# Altium footprint library General.PCBLIB: 231 footprints (part 10 of 15)
Each footprint in its own frame and in the unit in brackets; x right, y up, seen from the top. Pads: shape width x height; smd on the part's side, far side on the other; paste and mask are expansions set on the pad; w line width, h text height; cw(c..) or ccw(c..) is an arc to the next point about the centre after c.
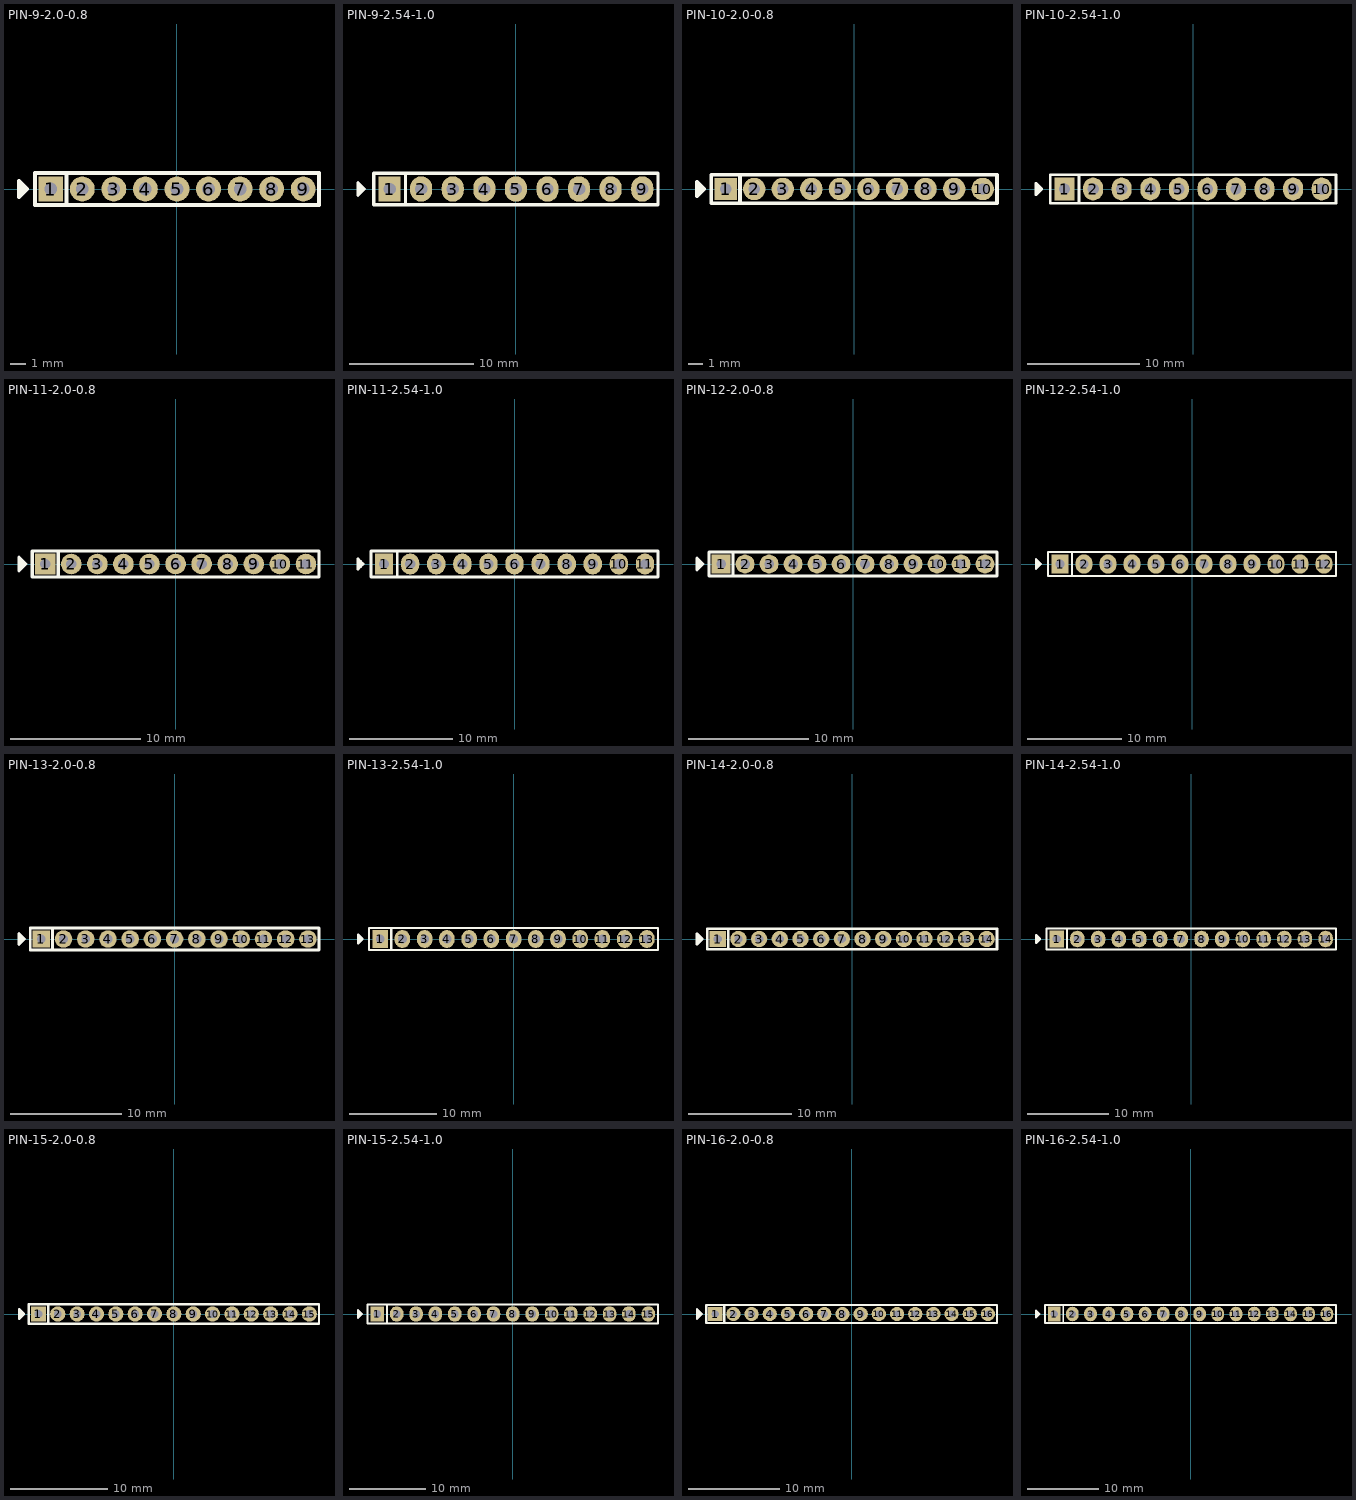
[diagram p9: the footprints below, top view; thin cyan lines are the x and y axes]

## PIN-9-2.0-0.8 [mil] "Pin Header"
height 149.61
pads (9):
  rect 62x62 hole 31.5: 1(-314.96,0)
  round 62 hole 31.5: 2(-236.22,0) 3(-157.48,0) 4(-78.74,0) 5(0,0) 6(78.74,0) 7(157.48,0) 8(236.22,0) 9(314.96,0)
Top Overlay:
  lines w10: -384.02,-10 -384.02,10 ; -275.59,-39.37 -275.59,39.37 ; -394.02,-20 -374.02,0 -394.02,20 -394.02,-20 ; -354.33,-39.37 -354.33,39.37 354.33,39.37 354.33,-39.37 -354.33,-39.37
3D body "Samtec-MTMM-109-02-G-S-150.STEP": height 209, standoff -46, extent -354.33,-39.37 353.97,39.33

## PIN-9-2.54-1.0 [mil] "Pin Header"
height 374.02
pads (9):
  rect 70x80 hole 39.37: 1(-400,0)
  oval 70x80 hole 39.37: 2(-300,0) 3(-200,0) 4(-100,0) 5(0,0) 6(100,0) 7(200,0) 8(300,0) 9(400,0)
Top Overlay:
  lines w10: -490,-10 -490,10 ; -350,-50 -350,50 ; -500,-20 -500,20 -480,0 -500,-20 ; -450,-50 -450,50 450,50 450,-50 -450,-50
3D body "PIN9_100mils.STEP": height 397.64, standoff -59.06, extent -450,-50 450,50

## PIN-10-2.0-0.8 [mm] "Pin Header"
height 3.8
pads (10):
  rect 1.575x1.575 hole 0.8: 1(-9,0)
  round 1.575 hole 0.8: 2(-7,0) 3(-5,0) 4(-3,0) 5(-1,0) 6(1,0) 7(3,0) 8(5,0) 9(7,0) 10(9,0)
Top Overlay:
  lines w0.254: -10.754,-0.254 -10.754,0.254 ; -8,-1 -8,1 ; -11.008,-0.508 -11.008,0.508 -10.5,0 -11.008,-0.508 ; -10,-1 10,-1 10,1 -10,1 -10,-1
3D body "Samtec-MTMM-110-02-G-S-150.STEP": height 5.31, standoff -1.17, extent -10,-1 9.99,0.999

## PIN-10-2.54-1.0 [mil] "Pin Header"
height 374.02
pads (10):
  rect 70x80 hole 39.37: 1(-450,0)
  oval 70x80 hole 39.37: 2(-350,0) 3(-250,0) 4(-150,0) 5(-50,0) 6(50,0) 7(150,0) 8(250,0) 9(350,0) 10(450,0)
Top Overlay:
  lines w10: -540,-10 -540,10 ; -400,-50 -400,50 ; -550,-20 -530,0 -550,20 -550,-20 ; -500,-50 500,-50 500,50 -500,50 -500,-50
3D body "PIN10_100mils.STEP": height 397.64, standoff -59.06, extent -500,-50 500,50

## PIN-11-2.0-0.8 [mil] "Pin Header"
height 149.61
pads (11):
  rect 62x62 hole 31.5: 1(-393.7,0)
  round 62 hole 31.5: 2(-314.96,0) 3(-236.22,0) 4(-157.48,0) 5(-78.74,0) 6(0,0) 7(78.74,0) 8(157.48,0) 9(236.22,0) 10(314.96,0) 11(393.7,0)
Top Overlay:
  lines w10: -462.76,-10 -462.76,10 ; -354.33,-39.37 -354.33,39.37 ; -472.76,-20 -472.76,20 -452.76,0 -472.76,-20 ; -433.07,-39.37 433.07,-39.37 433.07,39.37 -433.07,39.37 -433.07,-39.37
3D body "Samtec-MTMM-111-02-G-S-150.STEP": height 209, standoff -46, extent -433.07,-39.37 432.63,39.33

## PIN-11-2.54-1.0 [mil] "Pin Header"
height 374.02
pads (11):
  rect 70x80 hole 39.37: 1(-500,0)
  oval 70x80 hole 39.37: 2(-400,0) 3(-300,0) 4(-200,0) 5(-100,0) 6(0,0) 7(100,0) 8(200,0) 9(300,0) 10(400,0) 11(500,0)
Top Overlay:
  lines w10: -590,-10 -590,10 ; -450,-50 -450,50 ; -600,-20 -580,0 -600,20 -600,-20 ; -550,-50 550,-50 550,50 -550,50 -550,-50
3D body "PIN11_100mils.STEP": height 397.64, standoff -59.06, extent -550,-50 550,50

## PIN-12-2.0-0.8 [mm] "Pin Header"
height 3.8
pads (12):
  rect 1.575x1.575 hole 0.8: 1(-11,0)
  round 1.575 hole 0.8: 2(-9,0) 3(-7,0) 4(-5,0) 5(-3,0) 6(-1,0) 7(1,0) 8(3,0) 9(5,0) 10(7,0) 11(9,0) 12(11,0)
Top Overlay:
  lines w0.254: -12.754,-0.254 -12.754,0.254 ; -10,-1 -10,1 ; -13.008,-0.508 -12.5,0 -13.008,0.508 -13.008,-0.508 ; -12,-1 -12,1 12,1 12,-1 -12,-1
3D body "Samtec-MTMM-112-02-G-S-150.STEP": height 5.31, standoff -1.17, extent -12,-1 11.988,0.999

## PIN-12-2.54-1.0 [mil] "Pin Header"
height 374.02
pads (12):
  rect 70x80 hole 39.37: 1(-550,0)
  oval 70x80 hole 39.37: 2(-450,0) 3(-350,0) 4(-250,0) 5(-150,0) 6(-50,0) 7(50,0) 8(150,0) 9(250,0) 10(350,0) 11(450,0) 12(550,0)
Top Overlay:
  lines w10: -640,-10 -640,10 ; -500,-50 -500,50 ; -650,-20 -630,0 -650,20 -650,-20 ; -600,-50 600,-50 600,50 -600,50 -600,-50
3D body "PIN12_100mils.STEP": height 397.64, standoff -59.06, extent -600,-50 600,50

## PIN-13-2.0-0.8 [mil] "Pin Header"
height 149.61
pads (13):
  rect 62x62 hole 31.5: 1(-472.44,0)
  round 62 hole 31.5: 2(-393.7,0) 3(-314.96,0) 4(-236.22,0) 5(-157.48,0) 6(-78.74,0) 7(0,0) 8(78.74,0) 9(157.48,0) 10(236.22,0) 11(314.96,0) 12(393.7,0) 13(472.44,0)
Top Overlay:
  lines w10: -541.5,-10 -541.5,10 ; -433.07,-39.37 -433.07,39.37 ; -551.5,-20 -551.5,20 -531.5,0 -551.5,-20 ; -511.81,-39.37 511.81,-39.37 511.81,39.37 -511.81,39.37 -511.81,-39.37
3D body "Samtec-MTMM-113-02-G-S-150.STEP": height 209, standoff -46, extent -511.81,-39.37 511.29,39.33

## PIN-13-2.54-1.0 [mil] "Pin Header"
height 374.02
pads (13):
  rect 70x80 hole 39.37: 1(-600,0)
  oval 70x80 hole 39.37: 2(-500,0) 3(-400,0) 4(-300,0) 5(-200,0) 6(-100,0) 7(0,0) 8(100,0) 9(200,0) 10(300,0) 11(400,0) 12(500,0) 13(600,0)
Top Overlay:
  lines w10: -690,-10 -690,10 ; -550,-50 -550,50 ; -700,-20 -680,0 -700,20 -700,-20 ; -650,-50 650,-50 650,50 -650,50 -650,-50
3D body "PIN13_100mils.STEP": height 397.64, standoff -59.06, extent -650,-50 650,50

## PIN-14-2.0-0.8 [mm] "Pin Header"
height 3.8
pads (14):
  rect 1.575x1.575 hole 0.8: 1(-13,0)
  round 1.575 hole 0.8: 2(-11,0) 3(-9,0) 4(-7,0) 5(-5,0) 6(-3,0) 7(-1,0) 8(1,0) 9(3,0) 10(5,0) 11(7,0) 12(9,0) 13(11,0) 14(13,0)
Top Overlay:
  lines w0.254: -14.754,-0.254 -14.754,0.254 ; -12,-1 -12,1 ; -15.008,-0.508 -14.5,0 -15.008,0.508 -15.008,-0.508 ; -14,-1 -14,1 14,1 14,-1 -14,-1
3D body "Samtec-MTMM-114-02-G-S-150.STEP": height 5.31, standoff -1.17, extent -14,-1 13.986,0.999

## PIN-14-2.54-1.0 [mil] "Pin Header"
height 374.02
pads (14):
  rect 70x80 hole 39.37: 1(-650,0)
  oval 70x80 hole 39.37: 2(-550,0) 3(-450,0) 4(-350,0) 5(-250,0) 6(-150,0) 7(-50,0) 8(50,0) 9(150,0) 10(250,0) 11(350,0) 12(450,0) 13(550,0) 14(650,0)
Top Overlay:
  lines w10: -740,-10 -740,10 ; -600,-50 -600,50 ; -750,-20 -750,20 -730,0 -750,-20 ; -700,-50 -700,50 700,50 700,-50 -700,-50
3D body "PIN14_100mils.STEP": height 397.64, standoff -59.06, extent -700,-50 700,50

## PIN-15-2.0-0.8 [mil] "Pin Header"
height 149.61
pads (15):
  rect 62x62 hole 31.5: 1(-551.18,0)
  round 62 hole 31.5: 2(-472.44,0) 3(-393.7,0) 4(-314.96,0) 5(-236.22,0) 6(-157.48,0) 7(-78.74,0) 8(0,0) 9(78.74,0) 10(157.48,0) 11(236.22,0) 12(314.96,0) 13(393.7,0) 14(472.44,0) 15(551.18,0)
Top Overlay:
  lines w10: -620.24,-10 -620.24,10 ; -511.81,-39.37 -511.81,39.37 ; -630.24,-20 -610.24,0 -630.24,20 -630.24,-20 ; -590.55,-39.37 -590.55,39.37 590.55,39.37 590.55,-39.37 -590.55,-39.37
3D body "Samtec-MTMM-115-02-G-S-150.STEP": height 209, standoff -46, extent -590.55,-39.37 589.95,39.33

## PIN-15-2.54-1.0 [mil] "Pin Header"
height 374.02
pads (15):
  rect 70x80 hole 39.37: 1(-700,0)
  oval 70x80 hole 39.37: 2(-600,0) 3(-500,0) 4(-400,0) 5(-300,0) 6(-200,0) 7(-100,0) 8(0,0) 9(100,0) 10(200,0) 11(300,0) 12(400,0) 13(500,0) 14(600,0) 15(700,0)
Top Overlay:
  lines w10: -790,-10 -790,10 ; -650,-50 -650,50 ; -800,-20 -780,0 -800,20 -800,-20 ; -750,-50 750,-50 750,50 -750,50 -750,-50
3D body "PIN15_100mils.STEP": height 397.64, standoff -59.06, extent -750,-50 750,50

## PIN-16-2.0-0.8 [mm] "Pin Header"
height 3.8
pads (16):
  rect 1.575x1.575 hole 0.8: 1(-15,0)
  round 1.575 hole 0.8: 2(-13,0) 3(-11,0) 4(-9,0) 5(-7,0) 6(-5,0) 7(-3,0) 8(-1,0) 9(1,0) 10(3,0) 11(5,0) 12(7,0) 13(9,0) 14(11,0) 15(13,0) 16(15,0)
Top Overlay:
  lines w0.254: -16.754,-0.254 -16.754,0.254 ; -14,-1 -14,1 ; -17.008,-0.508 -17.008,0.508 -16.5,0 -17.008,-0.508 ; -16,-1 16,-1 16,1 -16,1 -16,-1
3D body "Samtec-MTMM-116-02-G-S-150.STEP": height 5.31, standoff -1.17, extent -16,-1 15.984,0.999

## PIN-16-2.54-1.0 [mil] "Pin Header"
height 374.02
pads (16):
  rect 70x80 hole 39.37: 1(-750,0)
  oval 70x80 hole 39.37: 2(-650,0) 3(-550,0) 4(-450,0) 5(-350,0) 6(-250,0) 7(-150,0) 8(-50,0) 9(50,0) 10(150,0) 11(250,0) 12(350,0) 13(450,0) 14(550,0) 15(650,0) 16(750,0)
Top Overlay:
  lines w10: -840,-10 -840,10 ; -700,-50 -700,50 ; -850,-20 -850,20 -830,0 -850,-20 ; -800,-50 -800,50 800,50 800,-50 -800,-50
3D body "PIN16_100mils.STEP": height 397.64, standoff -59.06, extent -800,-50 800,50